# Altium footprint library TrackCommanderCar_ControlPart.PcbLib: 56 footprints (part 3 of 4)
Each footprint in its own frame and in the unit in brackets; x right, y up, seen from the top. Pads: shape width x height; smd on the part's side, far side on the other; paste and mask are expansions set on the pad; w line width, h text height; cw(c..) or ccw(c..) is an arc to the next point about the centre after c.
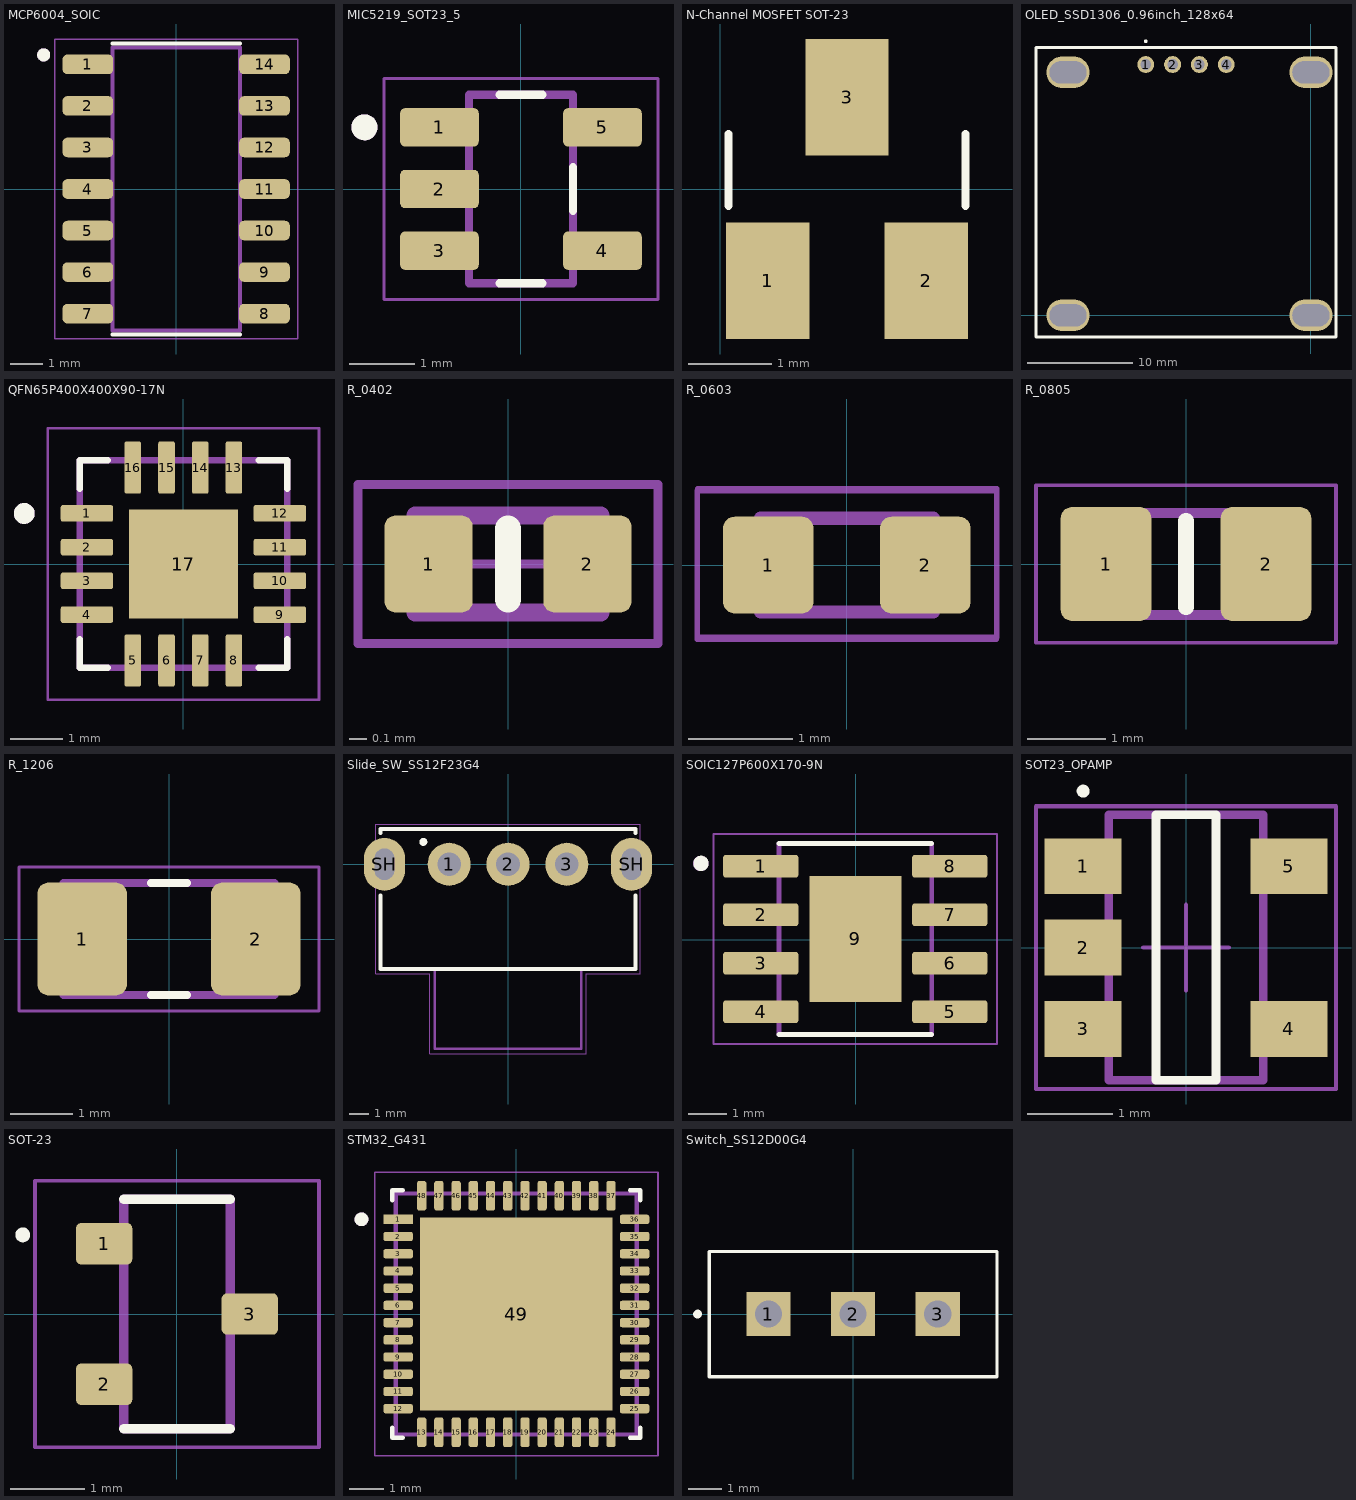
[diagram p2: the footprints below, top view; thin cyan lines are the x and y axes]

## MCP6004_SOIC [mm]
pads (14):
  rrect50% 1.55x0.6 smd mask+0.05: 1(-2.7,3.81) 2(-2.7,2.54) 3(-2.7,1.27) 4(-2.7,0) 5(-2.7,-1.27) 6(-2.7,-2.54) 7(-2.7,-3.81) 8(2.7,-3.81) 9(2.7,-2.54) 10(2.7,-1.27) 11(2.7,0) 12(2.7,1.27) 13(2.7,2.54) 14(2.7,3.81)
Top Overlay:
  circle w0.2: c-4.05,4.1 r0.1
  lines w0.127: -1.95,-4.452 1.95,-4.452 ; -1.95,4.452 1.95,4.452
Top Assembly (Mech13):
  circle w0.2: c-4.05,4.1 r0.1
  lines w0.127: -1.95,-4.325 -1.95,4.325 1.95,4.325 1.95,-4.325 -1.95,-4.325
Mechanical 15:
  lines w0.05: -3.71,-4.575 -3.71,4.575 3.71,4.575 3.71,-4.575 -3.71,-4.575
3D body "MCP6004-I_SL.STEP": height 1.75, standoff 0, extent -3,-4.325 3,4.325

## MIC5219_SOT23_5 [mm]
pads (5):
  rrect25% 1.21x0.59 smd mask+0.07: 1(-1.255,0.95) 2(-1.255,0) 3(-1.255,-0.95) 4(1.255,-0.95) 5(1.255,0.95)
Top Overlay:
  circle w0.2: c-2.41,0.95 r0.1
  lines w0.127: -0.33,-1.45 0.33,-1.45 ; -0.33,1.45 0.33,1.45 ; 0.8,-0.335 0.8,0.335
Top Assembly (Mech13):
  circle w0.2: c-2.41,0.95 r0.1
  lines w0.127: -0.8,-1.45 -0.8,1.45 0.8,1.45 0.8,-1.45 -0.8,-1.45
Mechanical 15:
  lines w0.05: -2.11,-1.7 2.11,-1.7 2.11,1.7 -2.11,1.7 -2.11,-1.7
3D body "step_temp.STEP": height 1.45, standoff 0, extent -1.35,-1.45 1.35,1.45

## N-Channel MOSFET SOT-23 [mm]
pads (3):
  rect 1x1.4 smd: 1(0.57,-1.1) 2(2.47,-1.1) 3(1.52,1.1)
Top Overlay:
  lines w0.1: 0.098,-0.2 0.098,0.66 ; 2.942,-0.2 2.942,0.66
3D body "SI2302CDS-T1-GE3.STEP": height 0, standoff -1.12, extent 0.06,-1.185 2.98,1.185

## OLED_SSD1306_0.96inch_128x64 [mm]
pads (8):
  round 1.6 hole 1 mask+0.1: 1(-15.64,23.745) 2(-13.1,23.745) 3(-10.56,23.745) 4(-8.02,23.745)
  oval 4.1x3 hole 2.1 slot 3.5 at 0 deg unplated: ""(-23,0) ""(-23,23) ""(0,0) ""(0,23)
Top Overlay:
  circle w0.3: c-15.64,25.945 r0.025
  lines w0.254: -26.03,-2.047 -26.03,25.353 2.37,25.353 2.37,-2.047 -26.03,-2.047
Mechanical 15:
  lines w0.05: -26.03,-2.047 -26.03,25.353 2.37,25.353 2.37,-2.047 -26.03,-2.047
3D body "Pantalla OLED 0.96'' 128x64.stp": height 5.55, standoff -5.45, extent -26.03,-2.147 2.37,25.253

## PCBComponent_1 [mm]

## QFN65P400X400X90-17N [mm]
height 0.9
pads (17):
  rrect25% 1.01x0.32 smd mask+0.07: 1(-1.86,0.975) 2(-1.86,0.325) 3(-1.86,-0.325) 4(-1.86,-0.975) 9(1.86,-0.975) 10(1.86,-0.325) 11(1.86,0.325) 12(1.86,0.975)
  rrect25% 0.32x1.01 smd mask+0.07: 5(-0.975,-1.86) 6(-0.325,-1.86) 7(0.325,-1.86) 8(0.975,-1.86) 13(0.975,1.86) 14(0.325,1.86) 15(-0.325,1.86) 16(-0.975,1.86)
  rect 2.1x2.1 smd paste-0.39 mask+0.07: 17(0,0)
Top Overlay:
  circle w0.2: c-3.07,0.975 r0.1
  lines w0.127: -2,-1.455 -2,-2 -1.455,-2 ; -2,1.455 -2,2 -1.455,2 ; 1.455,-2 2,-2 2,-1.455 ; 1.455,2 2,2 2,1.455
Top Assembly (Mech13):
  circle w0.2: c-3.07,0.975 r0.1
  lines w0.127: -2,-2 -2,2 2,2 2,-2 -2,-2
Mechanical 15:
  lines w0.05: -2.615,-2.615 -2.615,2.615 2.615,2.615 2.615,-2.615 -2.615,-2.615
3D body "step_temp.STEP": height 0.9, standoff 0, extent -2,-2 2,2

## R_0402 [mm]
pads (2):
  rrect25% 0.5x0.55 smd: 1(-0.45,0) 2(0.45,0)
Top Overlay:
  lines w0.15: 0,-0.2 0,0.2
Top Assembly (Mech13):
  lines w0.1: -0.525,-0.275 0.525,-0.275 0.525,0.275 -0.525,0.275 -0.525,-0.275
Mechanical 15:
  lines w0.05: -0.275,0 0.275,0 ; 0,-0.275 0,0.275 ; -0.85,-0.45 0.85,-0.45 0.85,0.45 -0.85,0.45 -0.85,-0.45
  text ".Designator" at -1.27,-0.127 h0.6
3D body "RES0402.step": height 0.3, standoff 0, extent -0.5,-0.25 0.5,0.25

## R_0603 [mm]
pads (2):
  rrect25% 0.87x0.93 smd mask+0.07: 1(-0.755,0) 2(0.755,0)
Top Assembly (Mech13):
  lines w0.127: -0.83,-0.45 0.83,-0.45 0.83,0.45 -0.83,0.45 -0.83,-0.45
Mechanical 15:
  lines w0.05: -1.44,-0.715 1.44,-0.715 1.44,0.715 -1.44,0.715 -1.44,-0.715 ; -1.436,-0.695 -1.436,0.735 1.444,0.735 1.444,-0.695 -1.436,-0.695
3D body "step_temp.STEP": height 0.55, standoff 0, extent -0.775,-0.4 0.775,0.4

## R_0805 [mm]
pads (2):
  rrect25% 1.15x1.45 smd mask+0.07: 1(-1.016,0)
  rrect25% 1.15x1.45 smd paste-2539.97 mask+0.07: 2(1.016,0)
Top Overlay:
  lines w0.2: 0,-0.55 0,0.55
Top Paste:
  region: 0.441,-0.437 0.441,0.437 0.441,0.466 0.452,0.521 0.474,0.574 0.505,0.621 0.545,0.661 0.592,0.692 0.645,0.714 0.7,0.725 0.728,0.725 1.304,0.725 1.332,0.725 1.387,0.714 1.44,0.692 1.487,0.661 1.527,0.621 1.558,0.574 1.58,0.521 1.591,0.466 1.591,0.437 1.591,-0.437 1.591,-0.466 1.58,-0.521 1.558,-0.574 1.527,-0.621 1.487,-0.661 1.44,-0.692 1.387,-0.714 1.332,-0.725 1.304,-0.725 0.728,-0.725 0.7,-0.725 0.645,-0.714 0.592,-0.692 0.545,-0.661 0.505,-0.621 0.474,-0.574 0.452,-0.521 0.441,-0.466
Top Assembly (Mech13):
  region: 1,-0.65 0.5,-0.65 0.5,0.65 1,0.65
  region: -0.5,-0.65 -1,-0.65 -1,0.65 -0.5,0.65
  lines w0.127: -1,-0.65 -1,0.65 1,0.65 1,-0.65 -1,-0.65
Mechanical 15:
  lines w0.05: -1.905,-1 -1.905,1 1.905,1 1.905,-1 -1.905,-1
3D body "step_temp.STEP": height 0.65, standoff 0, extent -1,-0.625 1,0.625

## R_1206 [mm]
pads (2):
  rrect25% 1.44x1.82 smd mask+0.07: 1(-1.397,0) 2(1.397,0)
Top Overlay:
  lines w0.127: -0.29,-0.9 0.29,-0.9 ; -0.29,0.9 0.29,0.9
Top Assembly (Mech13):
  lines w0.127: -1.7,-0.9 1.7,-0.9 1.7,0.9 -1.7,0.9 -1.7,-0.9
Mechanical 15:
  lines w0.05: -2.413,-1.158 2.413,-1.158 2.413,1.158 -2.413,1.158 -2.413,-1.158
3D body "step_temp.STEP": height 0.65, standoff 0, extent -1.55,-0.775 1.55,0.775

## Slide_SW_SS12F23G4 [mm]
pads (5):
  round 2.2 hole 1.2 mask+0.07: 1(-3,0) 2(0,0) 3(3,0)
  oval 2.1x2.7 hole 1 slot 1.6 at 90 deg mask+0.07: SH(-6.3,0) SH(6.3,0)
Top Overlay:
  circle w0.2: c-4.318,1.143 r0.1
  lines w0.2: -6.5,-1.6 -6.5,-5.35 6.5,-5.35 6.5,-1.6 ; -6.5,1.6 -6.5,1.8 6.5,1.8 6.5,1.6
Top Assembly (Mech13):
  lines w0.127: -6.5,-2.1 -6.5,-5.35 -3.745,-5.35 3.745,-5.35 6.5,-5.35 6.5,-2.1 ; -3.745,-5.395 -3.745,-9.395 3.745,-9.395 3.745,-5.395
Mechanical 15:
  lines w0.05: -6.75,-5.588 -6.75,2.032 -4.344,2.032 2.566,2.032 6.75,2.032 6.75,-5.588 3.995,-5.588 3.995,-9.652 -3.995,-9.652 -3.995,-5.588 -6.75,-5.588
3D body "SS-8.step": height 5.6, standoff -3, extent -6.5,-10.35 6.5,0.45
3D body: height 5, standoff 0.5, extent -5.301,-1.301 5.301,-0.499

## SOIC127P600X170-9N [mm]
pads (9):
  rrect25% 1.97x0.6 smd mask+0.05: 1(-2.484,1.922) 2(-2.484,0.652) 3(-2.484,-0.618) 4(-2.484,-1.888) 5(2.466,-1.888) 6(2.466,-0.618) 7(2.466,0.652) 8(2.466,1.922)
  rect 2.41x3.3 smd paste-3 mask+0.05: 9(-0.009,0.017)
Top Overlay:
  circle w0.2: c-4.049,1.997 r0.1
  lines w0.127: -2.009,-2.483 1.991,-2.483 ; -2.009,2.517 1.991,2.517
Top Paste:
  region: 0.753,-1.025 -0.772,-1.025 -0.772,1.057 0.753,1.057
Top Assembly (Mech13):
  circle w0.2: c-4.053,1.994 r0.1
  lines w0.127: -2.009,-2.483 -2.009,2.517 1.991,2.517 1.991,-2.483 -2.009,-2.483
Mechanical 15:
  lines w0.05: -3.719,-2.733 -3.719,2.767 3.701,2.767 3.701,-2.733 -3.719,-2.733
3D body "step_temp.STEP": height 1.7, standoff 0, extent -3.009,-2.433 2.991,2.467

## SOT23_OPAMP [mm]
pads (5):
  rect 0.9x0.65 smd: 1(-1.2,0.95) 2(-1.2,0) 3(-1.2,-0.95) 4(1.2,-0.95) 5(1.2,0.95)
Top Overlay:
  circle w0.1: c-1.2,1.825 r0.025
  lines w0.1: -0.35,-1.55 0.35,-1.55 0.35,1.55 -0.35,1.55 -0.35,-1.55
Top Assembly (Mech13):
  lines w0.1: -0.9,-1.55 -0.9,1.55 0.9,1.55 0.9,-1.55 -0.9,-1.55
Mechanical 15:
  lines w0.05: -0.5,0 0.5,0 ; 0,-0.5 0,0.5 ; -1.75,-1.65 -1.75,1.65 1.75,1.65 1.75,-1.65 -1.75,-1.65
3D body: height 1.45, standoff 0, extent -0.9,-1.55 0.9,1.55

## SOT-23 [mm]
pads (3):
  rrect25% 0.76x0.56 smd mask+0.07: 1(-0.984,0.95) 2(-0.984,-0.95) 3(0.984,0)
Top Overlay:
  circle w0.1: c-2.086,1.07 r0.05
  lines w0.127: -0.72,-1.55 0.72,-1.55 ; -0.72,1.55 0.72,1.55
Top Assembly (Mech13):
  lines w0.127: -0.72,-1.55 -0.72,1.55 0.72,1.55 0.72,-1.55 -0.72,-1.55
Mechanical 15:
  lines w0.05: -1.92,-1.8 -1.92,1.8 1.92,1.8 1.92,-1.8 -1.92,-1.8
3D body "step_temp.STEP": height 1.14, standoff 0, extent -1.2,-1.45 1.2,1.45

## STM32_G431 [mm]
pads (49):
  rect 0.86x0.27 smd mask+0.05: 1(-3.435,2.75)
  rrect50% 0.86x0.27 smd mask+0.05: 2(-3.435,2.25) 3(-3.435,1.75) 4(-3.435,1.25) 5(-3.435,0.75) 6(-3.435,0.25) 7(-3.435,-0.25) 8(-3.435,-0.75) 9(-3.435,-1.25) 10(-3.435,-1.75) 11(-3.435,-2.25) 12(-3.435,-2.75) 25(3.435,-2.75) 26(3.435,-2.25) 27(3.435,-1.75) 28(3.435,-1.25) 29(3.435,-0.75) 30(3.435,-0.25) 31(3.435,0.25) 32(3.435,0.75) 33(3.435,1.25) 34(3.435,1.75) 35(3.435,2.25) 36(3.435,2.75)
  rrect50% 0.27x0.86 smd mask+0.05: 13(-2.75,-3.435) 14(-2.25,-3.435) 15(-1.75,-3.435) 16(-1.25,-3.435) 17(-0.75,-3.435) 18(-0.25,-3.435) 19(0.25,-3.435) 20(0.75,-3.435) 21(1.25,-3.435) 22(1.75,-3.435) 23(2.25,-3.435) 24(2.75,-3.435) 37(2.75,3.435) 38(2.25,3.435) 39(1.75,3.435) 40(1.25,3.435) 41(0.75,3.435) 42(0.25,3.435) 43(-0.25,3.435) 44(-0.75,3.435) 45(-1.25,3.435) 46(-1.75,3.435) 47(-2.25,3.435) 48(-2.75,3.435)
  rect 5.6x5.6 smd paste-4 mask+0.05: 49(0,0)
Top Overlay:
  circle w0.2: c-4.5,2.75 r0.1
  lines w0.127: -3.6,-3.3 -3.6,-3.6 -3.3,-3.6 ; -3.6,3.3 -3.6,3.6 -3.3,3.6 ; 3.3,-3.6 3.6,-3.6 3.6,-3.3 ; 3.3,3.6 3.6,3.6 3.6,3.3
Top Paste:
  region: 2.285,-2.285 0.515,-2.285 0.515,-0.515 2.285,-0.515
  region: -0.515,-2.285 -2.285,-2.285 -2.285,-0.515 -0.515,-0.515
  region: 2.285,0.515 0.515,0.515 0.515,2.285 2.285,2.285
  region: -0.515,0.515 -2.285,0.515 -2.285,2.285 -0.515,2.285
Top Assembly (Mech13):
  circle w0.2: c-4.5,2.75 r0.1
  lines w0.127: -3.5,-3.5 -3.5,3.5 3.5,3.5 3.5,-3.5 -3.5,-3.5
Mechanical 15:
  lines w0.05: -4.115,-4.115 -4.115,4.115 4.115,4.115 4.115,-4.115 -4.115,-4.115
3D body "step_temp.STEP": height 0.65, standoff 0, extent -3.5,-3.5 3.5,3.5

## Switch_SS12D00G4 [mm]
pads (3):
  rect 1.3x1.3 hole 0.8 square mask+0.1: 1(-2.5,0) 2(0,0) 3(2.5,0)
Top Overlay:
  lines w0.1: -4.25,-1.85 4.25,-1.85 4.25,1.85 -4.25,1.85 -4.25,-1.85
  lines w0.254: -4.6,-0.005 ccw(c-4.6,0.005) -4.59,0.005
Mechanical 15:
  lines w0.05: -4.25,-1.85 4.25,-1.85 4.25,1.856 -4.25,1.856 -4.25,-1.85
3D body "SS12D00G4 1P2T Straight.step": height 7.39, standoff -4.68, extent -4.305,-1.92 4.305,1.93